# Altium footprint library rcl.PCBLIB: 513 footprints (part 27 of 33)
Each footprint in its own frame and in the unit in brackets; x right, y up, seen from the top. Pads: shape width x height; smd on the part's side, far side on the other; paste and mask are expansions set on the pad; w line width, h text height; cw(c..) or ccw(c..) is an arc to the next point about the centre after c.
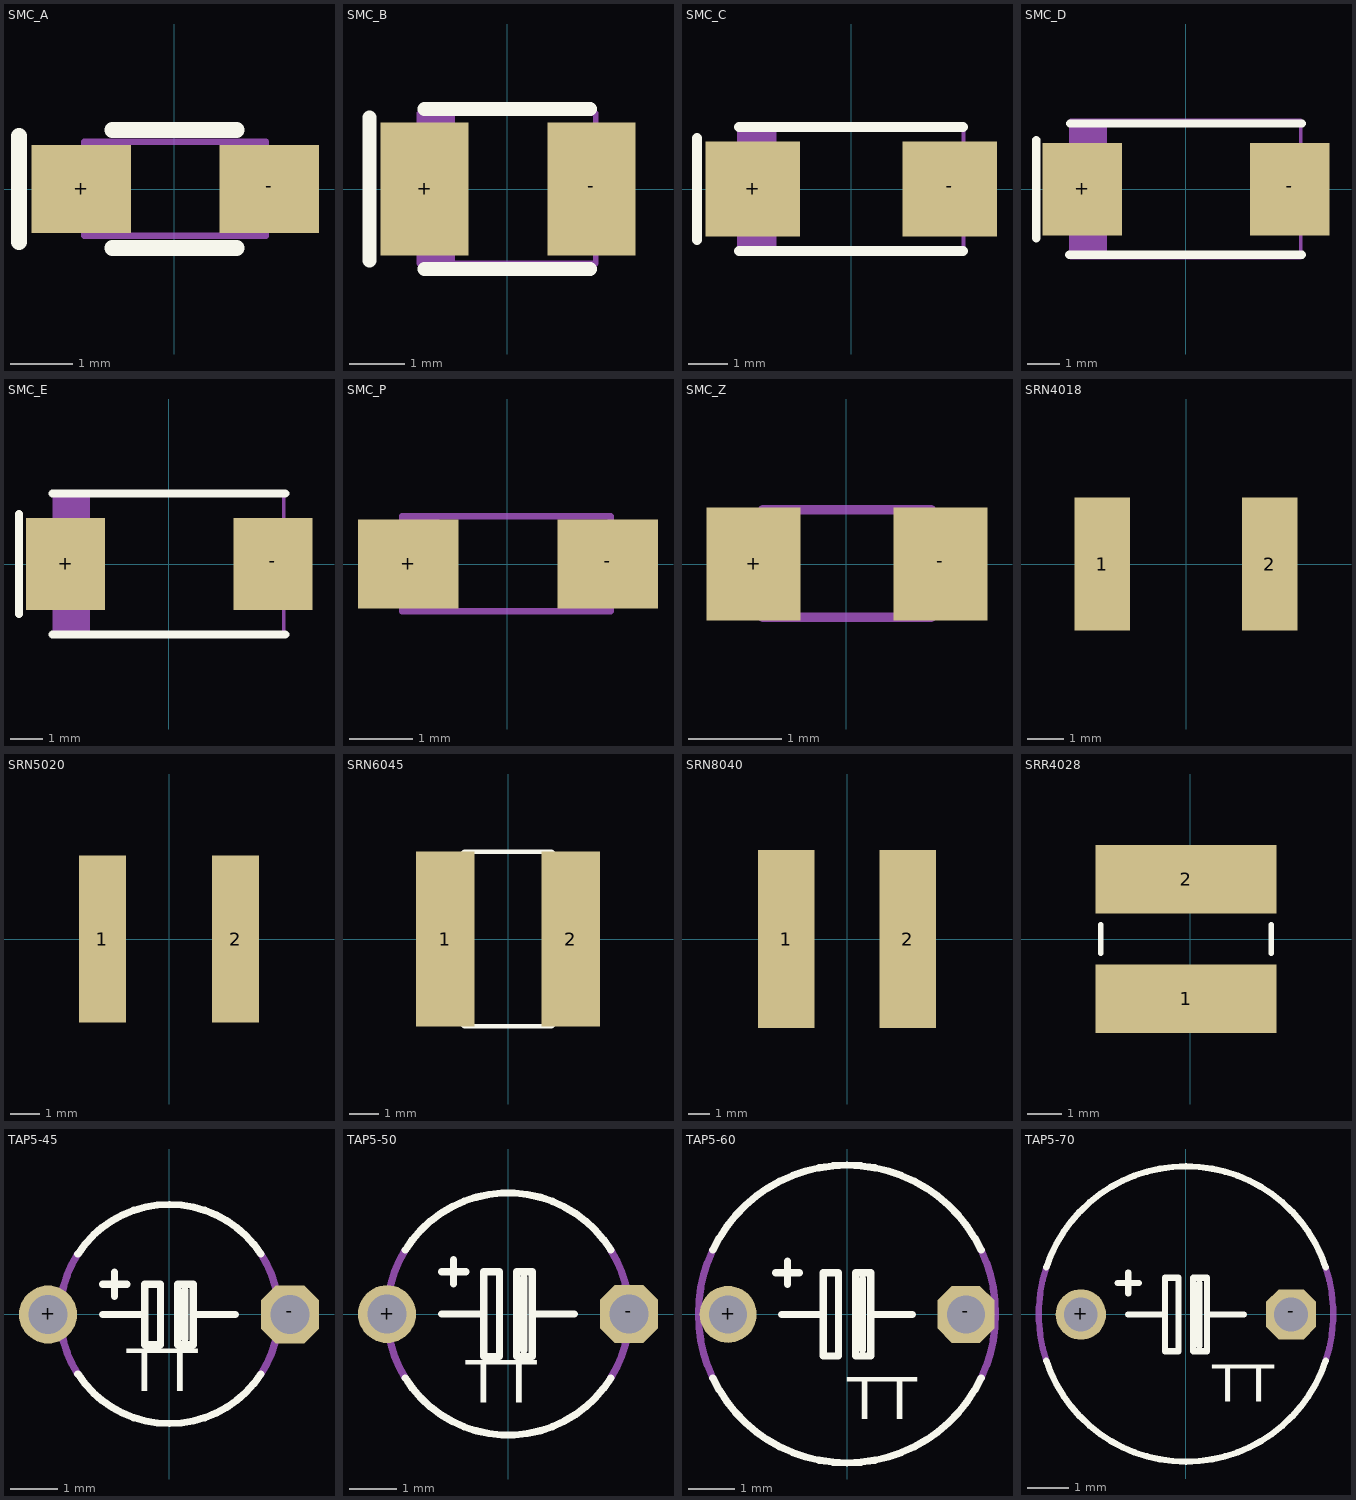
[diagram p26: the footprints below, top view; thin cyan lines are the x and y axes]

## SMC_A [mil]
pads (2):
  rect 63x56 smd: +(-59.06,0) -(60,0)
Top Overlay:
  lines w10: -98.43,-33.46 -98.43,33.46 ; -39.37,-37.4 39.37,-37.4 ; -39.37,37.4 39.37,37.4
Mechanical 4:
  rectangle: -57.09,-29.53 -31.5,30
  region: 63,24 56,24 56,-23.62 63,-23.62
  rectangle: -62.99,-23.62 -55.12,24
  lines w4: -57.09,-29.53 -57.09,30 58,30 58,-29.53 -57.09,-29.53
3D body "T55_A-case.stp": height 70.87, standoff 0, extent -66.93,-35.43 66.93,35.44

## SMC_B [mil]
pads (2):
  rect 63x95 smd: +(-59.06,0) -(60,0)
Top Overlay:
  lines w10: -98.43,-51.18 -98.43,51.18 ; -59.06,-57.09 59.06,-57.09 ; -59.06,57.09 59.06,57.09
Mechanical 4:
  rectangle: -62.99,-53.15 -37.4,54
  region: 69,44 62,44 62,-43.31 69,-43.31
  rectangle: -68.9,-43.31 -61.02,44
  lines w4: -62.99,-53.15 -62.99,54 63,54 63,-53.15 -62.99,-53.15
3D body "T55_B-case.stp": height 82.68, standoff 0, extent -72.84,-59.05 72.83,59.06

## SMC_C [mil]
pads (2):
  rect 95x95 smd: +(-98.43,0) -(99,0)
Top Overlay:
  lines w10: -154.53,-51.18 -154.53,51.18 ; -112.2,-62.01 112.2,-62.01 ; -112.2,62.01 112.2,62.01
Mechanical 4:
  rectangle: -118.11,-43.31 -110.24,44
  region: 119,44 111,44 111,-43.31 119,-43.31
  rectangle: -112.2,-61.02 -74.8,62
  lines w4: -112.2,-61.02 113,-61.02 113,62 -112.2,62 -112.2,-61.02

## SMC_D [mil]
pads (2):
  rect 95x111 smd: +(-124.02,0) -(125,0)
Top Overlay:
  lines w10: -179.13,-59.06 -179.13,59.06 ; -139.76,-78.74 139.76,-78.74 ; -138.78,78.74 139.76,78.74
Mechanical 4:
  rectangle: -143.7,-47.24 -135.83,48
  region: 144,48 136,48 136,-47.24 144,-47.24
  rectangle: -137.8,-82.68 -94.49,83
  lines w4: -137.8,-82.68 138,-82.68 138,83 -137.8,83 -137.8,-82.68
3D body "T55_D-case.stp": height 118.11, standoff 0, extent -147.64,-90.54 147.64,90.56

## SMC_E [mil]
pads (2):
  rect 95x111 smd: +(-124.02,0) -(125,0)
Top Overlay:
  lines w10: -180.12,-60.04 -180.12,60.04 ; -139.76,-84.65 139.76,-84.65 ; -139.76,84.65 139.76,84.65
Mechanical 4:
  rectangle: -137.8,-82.68 -94.49,83
  region: 144,48 136,48 136,-47.24 144,-47.24
  rectangle: -143.7,-47.24 -135.83,48
  lines w4: -137.8,-82.68 -137.8,83 138,83 138,-82.68 -137.8,-82.68

## SMC_P [mil]
pads (2):
  rect 63x56 smd: +(-62.01,0) -(63,0)
Mechanical 4:
  rectangle: -70.87,-17.72 -66.93,18
  region: 71,18 67,18 67,-17.72 71,-17.72
  rectangle: -64.96,-29.53 -42.32,29
  lines w4: -65.94,-29.53 65,-29.53 65,30 -65.94,30 -65.94,-29.53
3D body "T55_P-case.stp": height 43.31, standoff -3.94, extent -41.34,-27.56 41.34,27.56

## SMC_Z [mil]
pads (2):
  rect 40x48 smd: +(-39.37,0) -(40,0)
Mechanical 4:
  rectangle: -39.37,-17.72 -35.43,18
  region: 40,18 36,18 36,-17.72 40,-17.72
  rectangle: -35.43,-23.62 -19.68,24
  lines w4: -35.43,-22.64 36,-22.64 36,23 -35.43,23 -35.43,-22.64

## SRN4018 [mm] "Semi-shielded Power Inductors"
height 1.8
pads (2):
  rect 1.5x3.6 smd: 1(-2.275,0) 2(2.275,0)
3D body "srn4012t-4r7m.stp": height 1.2, standoff -0.01, extent -2.01,-2.01 2.01,2.01

## SRN5020 [mm] "Semi-shielded Power Inductors"
height 1.8
pads (2):
  rect 1.6x5.7 smd: 1(-2.275,0) 2(2.275,0)
3D body "srn5020.stp": height 2, standoff 0, extent -2.5,-2.5 2.5,2.5

## SRN6045 [mil]
pads (2):
  rect 79x236 smd: 1(-84.65,0) 2(84.65,0)
Top Overlay:
  lines w6: -32,-118 32,-118 ; -32,118 32,118 ; -118,-59 -118,59 -59,118 59,118 118,59 118,-59 59,-118 -59,-118 -118,-59
3D body "User Library-SRN6045 Series.step": height 177.17, standoff 0, extent -124.01,-118.1 124.02,118.12

## SRN8040 [mm] "Semi-shielded Power Inductors"
height 4
pads (2):
  rect 2.6x8.2 smd: 1(-2.8,0) 2(2.8,0)
3D body "User Library-Inductor SRN8040 Series.step": height 4, standoff 0, extent -4,-4.009 4,4.009

## SRR4028 [mil] "Semi-shielded Power Inductors"
height 70.87
pads (2):
  rect 209x79 smd: 1(-5,-69) 2(-5,69)
Top Overlay:
  lines w6: -103.5,-16.4 -103.5,16.4 ; 93.5,-16.4 93.5,16.4
3D body "srr4028.stp": height 106.3, standoff -3.94, extent -99.41,-95.47 89.57,93.51

## TAP5-45 [mil]
pads (2):
  round 48 hole 32: +(-100,0)
  oct 48x48 hole 32: -(100,0)
Top Overlay:
  lines w6: -75.37,-49.18 ccw(c0.32,0.21) 76,-49.18 ; -75.37,50 cw(c0.32,0.61) 76,50 ; -55,0 -20,0 ; -55,25 -35,25 ; -45,15 -45,35 ; 13,-20 13,20 ; 55,0 20,0 ; -20,0 -20,25 -7,25 -7,-25 -20,-25 -20,0 ; 20,0 20,25 7,25 7,-25 20,-25 20,0
  text "TT" at -35,-75 h60.45
Mechanical 4:
  lines w6: -75.37,-49.18 cw(c0.63,0.41) -75.37,50 ; 76,-49.18 ccw(c0,0.41) 76,50

## TAP5-50 [mil]
pads (2):
  round 48 hole 32: +(-100,0)
  oct 48x48 hole 32: -(100,0)
Top Overlay:
  lines w6: -84.87,-52.88 ccw(c0.07,0.04) 85,-52.88 ; -84.87,53 cw(c0.07,0.08) 85,53 ; -55,0 -20,0 ; -55,35 -35,35 ; -45,25 -45,45 ; 13,-30 13,30 ; 55,0 20,0 ; -20,0 -20,35 -7,35 -7,-35 -20,-35 -20,0 ; 20,0 20,35 7,35 7,-35 20,-35 20,0
  text "TT" at -35,-85 h60.45
Mechanical 4:
  lines w6: -84.87,-52.88 cw(c0.09,0.06) -84.87,53 ; 85,-52.88 ccw(c0.04,0.06) 85,53

## TAP5-60 [mil]
pads (2):
  round 48 hole 32: +(-100,0)
  oct 48x48 hole 32: -(100,0)
Top Overlay:
  lines w6: -113,-53.44 ccw(c0,0) 113,-53.44 ; -113,54 cw(c0,0.56) 113,54 ; -60,35 -40,35 ; -55,0 -20,0 ; -50,25 -50,45 ; 13,-30 13,30 ; 55,0 20,0 ; -20,0 -20,-35 -7,-35 -7,35 -20,35 -20,0 ; 20,0 20,-35 7,-35 7,35 20,35 20,0
  text "TT" at 0,-100 h60.45
Mechanical 4:
  lines w6: -113,-53.44 cw(c0.59,0.28) -113,54 ; 113,-53.44 ccw(c-0.59,0.28) 113,54

## TAP5-70 [mil]
pads (2):
  round 48 hole 32: +(-100,0)
  oct 48x48 hole 32: -(100,0)
Top Overlay:
  lines w6: -132.87,-44.09 ccw(c0.07,0.02) 133,-44.09 ; -132.87,45 cw(c0.07,0.89) 133,45 ; -65,30 -45,30 ; -55,0 -20,0 ; -55,20 -55,40 ; 13,-30 13,30 ; 55,0 20,0 ; -20,0 -20,-35 -7,-35 -7,35 -20,35 -20,0 ; 20,0 20,-35 7,-35 7,35 20,35 20,0
  text "TT" at 25,-95 h60.45
Mechanical 4:
  lines w6: -132.87,-44.09 cw(c1.37,0.45) -132.87,45 ; 133,-44.09 ccw(c-1.24,0.45) 133,45